# Altium footprint library UltraZOhm_CarrierBoard.PcbLib: 124 footprints (part 1 of 8)
Each footprint in its own frame and in the unit in brackets; x right, y up, seen from the top. Pads: shape width x height; smd on the part's side, far side on the other; paste and mask are expansions set on the pad; w line width, h text height; cw(c..) or ccw(c..) is an arc to the next point about the centre after c.
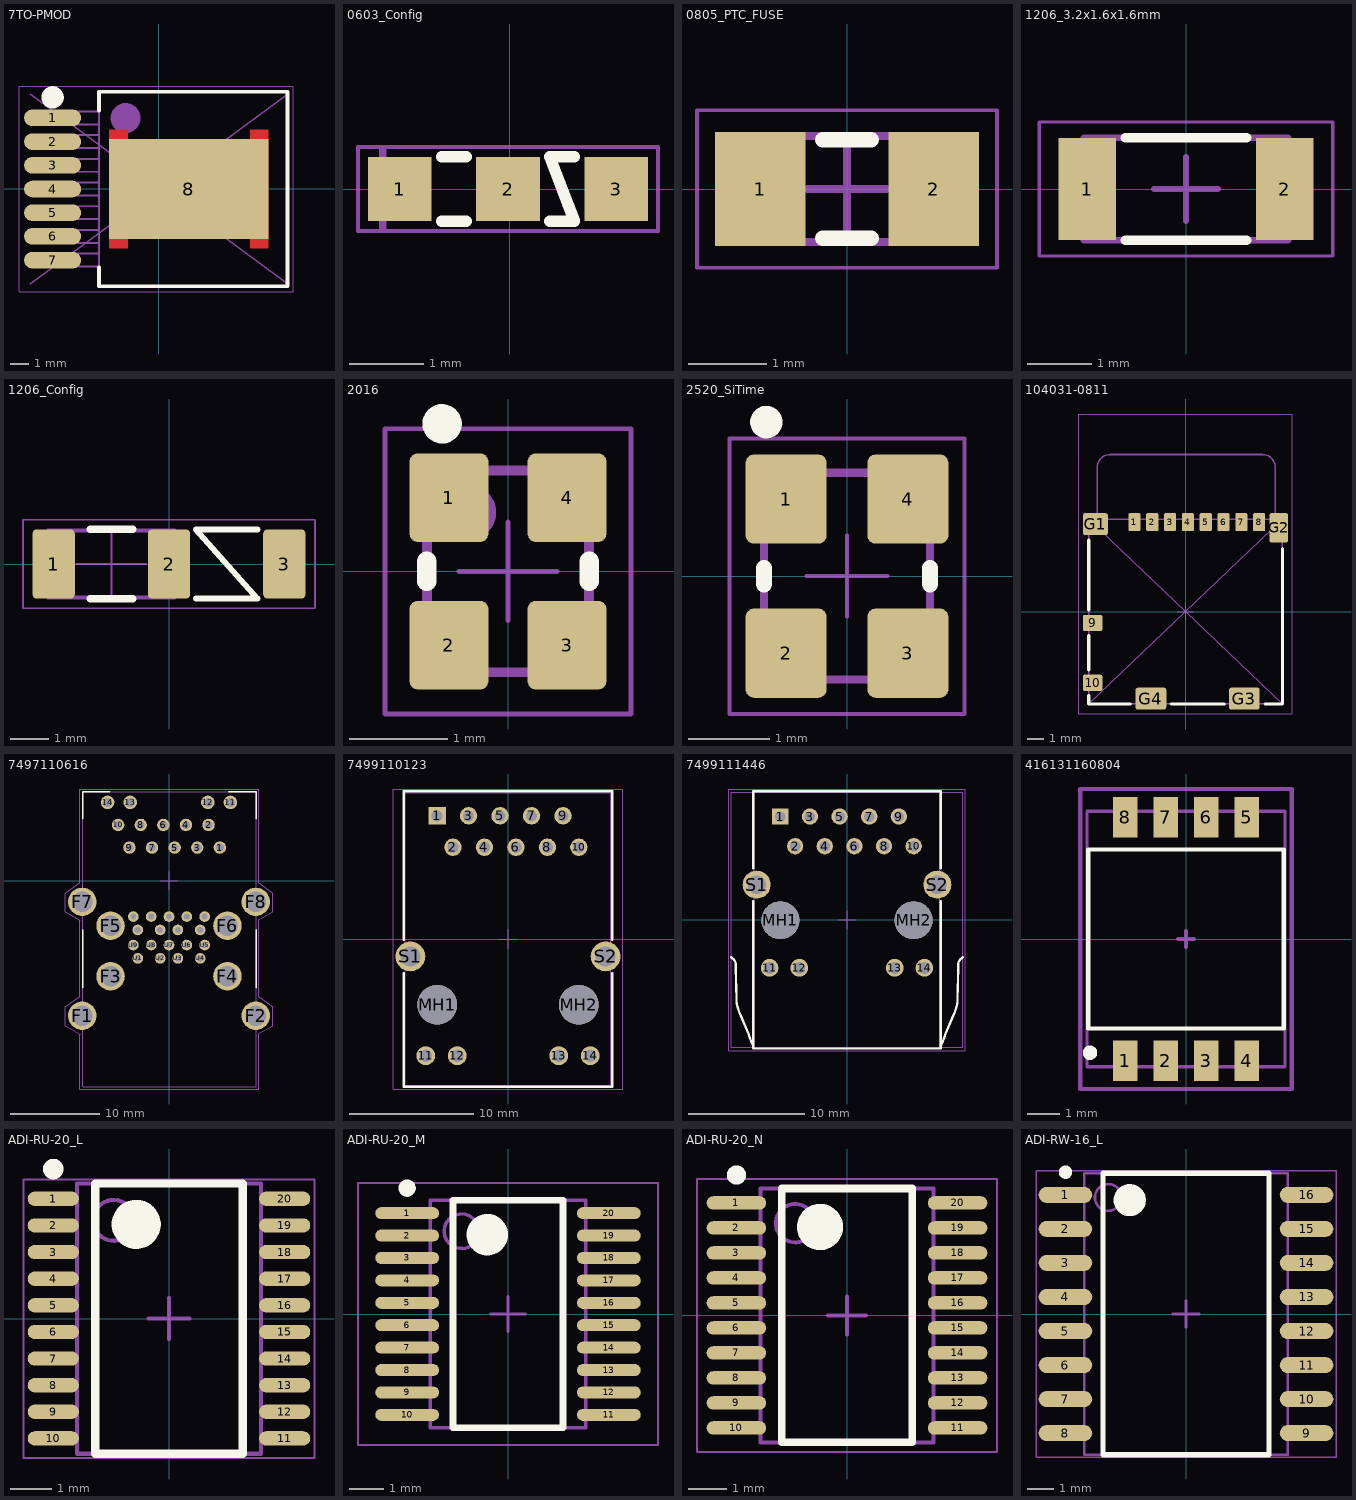
[diagram p0: the footprints below, top view; thin cyan lines are the x and y axes]

## 7TO-PMOD [mm]
height 4.67
pads (8):
  oval 3.06x0.89 smd: 1(-5.7,3.81) 2(-5.7,2.54) 3(-5.7,1.27) 4(-5.7,0) 5(-5.7,-1.27) 6(-5.7,-2.54) 7(-5.7,-3.81)
  rect 8.54x5.35 smd: 8(1.605,0)
Top Layer:
  region: -2.665,3.2 -2.665,-3.2 -1.665,-3.2 -1.665,3.2
  region: 5.875,-3.2 5.875,3.2 4.875,3.2 4.875,-3.2
Top Overlay:
  circle w0.6: c-5.7,4.91 r0.3
  lines w0.2: -3.215,-4.205 -3.215,-5.205 6.885,-5.205 6.885,5.205 -3.215,5.205 -3.215,4.205
M5 Assembly Top:
  circle w0.8: c-1.79,3.8 r0.4
  lines w0.1: -6.89,-4.155 -3.215,-4.155 ; -6.89,-3.465 -3.215,-3.465 ; -6.89,-2.885 -3.215,-2.885 ; -6.89,-2.195 -3.215,-2.195 ; -6.89,-1.615 -3.215,-1.615 ; -6.89,-0.925 -3.215,-0.925 ; -6.89,-0.345 -3.215,-0.345 ; -6.89,0.345 -3.215,0.345 ; -6.89,0.925 -3.215,0.925 ; -6.89,1.615 -3.215,1.615 ; -6.89,2.195 -3.215,2.195 ; -6.89,2.885 -3.215,2.885 ; -6.89,3.465 -3.215,3.465 ; -6.89,4.155 -3.215,4.155 ; -6.885,-4.155 -6.885,-3.465 ; -6.885,-2.885 -6.885,-2.195 ; -6.885,-1.615 -6.885,-0.925 ; -6.885,-0.345 -6.885,0.345 ; -6.885,0.925 -6.885,1.615 ; -6.885,2.195 -6.885,2.885 ; -6.885,3.465 -6.885,4.155 ; -4.79,-4.155 -4.79,-3.465 ; -4.79,-2.885 -4.79,-2.195 ; -4.79,-1.615 -4.79,-0.925 ; -4.79,-0.345 -4.79,0.345 ; -4.79,0.93 -4.79,1.615 ; -4.79,2.205 -4.79,2.885 ; -4.79,3.465 -4.79,4.155 ; -3.215,-5.205 6.885,-5.205 6.885,5.205 -3.215,5.205 -3.215,-5.205
  text ".Designator" at 2.725,-1.89 h1.52
Mechanical 15:
  lines w0.05: -0.5,0 0.5,0 ; 0,-0.5 0,0.5 ; -7.5,-5.5 7.2,-5.5 7.2,5.5 -7.5,5.5 -7.5,-5.5
  lines w0.1: -6.885,-5.08 6.885,5.08 ; -6.885,5.08 6.885,-5.08
3D body "NDW0007A.stp": height 4.77, standoff 0, extent -6.885,-5.08 6.885,5.08
3D body: height 4.8, standoff 0, extent -2.139,2.275 -0.14,4.275

## 0603_Config [mm] "0603 3-Pin Config Footprint"
height 1
pads (3):
  rect 0.85x0.85 smd: 1(-1.475,0) 2(-0.025,0) 3(1.425,0)
Top Overlay:
  lines w0.152: -0.914,-0.432 -0.584,-0.432 ; -0.914,0.432 -0.584,0.432 ; 0.533,-0.432 0.864,-0.432 0.533,0.432 0.864,0.432
M5 Assembly Top:
  lines w0.054: -2.032,-0.559 -2.032,0.559 1.981,0.559 1.981,-0.559 -2.032,-0.559
  lines w0.102: -1.7,-0.525 -1.7,0.525
  text ".Designator" at -1.4,-0.4 h0.76
3D body: height 2.8, standoff -2.8, extent -1.537,-1.143 -1.537,-1.143
3D body "User Library-RESC1608X___.STEP": height 0.3, standoff 0, extent -1.55,-0.4 0.05,0.4

## 0805_PTC_FUSE [mm] "Surface Mount PTC, Body 2.0x1.2mm, Height 1.0mm, IPC Medium Density"
height 1
pads (2):
  rect 1.15x1.45 smd: 1(-1.1,0) 2(1.1,0)
Top Overlay:
  lines w0.2: -0.304,-0.625 0.304,-0.625 ; -0.304,0.625 0.304,0.625
M5 Assembly Top:
  lines w0.1: -1.05,-0.675 1.05,-0.675 1.05,0.675 -1.05,0.675 -1.05,-0.675
  text ".Designator" at -0.8,-0.4 h0.76
Mechanical 15:
  lines w0.05: -1.905,1 1.902,1 1.902,-1 ; -1.902,1 -1.902,-1 1.905,-1
  lines w0.1: -0.5,0 0.5,0 ; 0,-0.5 0,0.5
3D body: height 0.6, standoff 0, extent 0.7,-0.675 1.05,0.675
3D body: height 0.6, standoff 0, extent -1.05,-0.675 -0.7,0.675
3D body: height 0.6, standoff 0, extent -0.7,-0.675 0.7,0.675

## 1206_3.2x1.6x1.6mm [mm] "Ceramic Capacitors, 1206, body 3.2x1.6mm"
height 1.6
pads (2):
  rect 0.9x1.6 smd: 1(-1.55,0) 2(1.55,0)
Top Overlay:
  lines w0.15: -0.95,-0.8 0.95,-0.8 ; -0.95,0.8 0.95,0.8
M5 Assembly Top:
  lines w0.1: -1.6,-0.8 1.6,-0.8 1.6,0.8 -1.6,0.8 -1.6,-0.8
  text ".Designator" at -1,-0.4 h0.76
Mechanical 15:
  lines w0.05: -2.3,-1.05 2.3,-1.05 2.3,1.05 -2.3,1.05 -2.3,-1.05
  lines w0.1: -0.5,0 0.5,0 ; 0,-0.5 0,0.5
3D body "3.2x1.6x1.6x0.6.stp": height 1.63, standoff 0.03, extent -1.6,-0.8 1.6,0.8

## 1206_Config [mm] "1206 3-Pin Config Footprint"
height 1
pads (3):
  rrect20% 1.1x1.8 smd: 1(-3,0) 2(0,0) 3(3,0)
Top Overlay:
  lines w0.152: 0.7,-0.9 2.3,-0.9 0.7,0.9 2.3,0.9
  lines w0.2: -2.05,-0.9 -0.95,-0.9 ; -2.05,0.9 -0.95,0.9
M5 Assembly Top:
  lines w0.1: -2.6,-0.875 -2.6,0.875 ; -0.4,-0.875 -0.4,0.875 ; -3.15,-0.875 -1.5,-0.875 0.15,-0.875 0.15,0.875 -3.15,0.875 -3.15,-0.875
  text ".Designator" at -2.3,-0.4 h0.76
Mechanical 15:
  lines w0.05: -2.4,0 -1.5,0 ; -1.5,-0.9 -1.5,0 ; -1.5,0.9 -1.5,0 ; -0.6,0 -1.5,0 ; -3.8,-1.15 -1.5,-1.15 3.8,-1.15 3.8,1.15 -3.8,1.15 -3.8,-1.15
3D body: height 2.8, standoff -2.8, extent -1.537,1.357 -1.537,1.357
3D body "RESC3216X06N.STEP": height 0.55, standoff 0, extent -3.1,-0.8 0.1,0.8

## 2016 [mm]
height 0.8
pads (4):
  rrect20% 0.8x0.9 smd: 1(-0.6,0.75) 2(-0.6,-0.75) 3(0.6,-0.75) 4(0.6,0.75)
Top Overlay:
  circle w0.2: c-0.67,1.5 r0.1
  lines w0.2: -0.825,-0.1 -0.825,0.1 ; 0.825,-0.1 0.825,0.1
M5 Assembly Top:
  circle w0.28: c-0.4,0.6 r0.14
  lines w0.1: -0.825,-1.025 0.825,-1.025 0.825,1.025 ; -0.825,-1.025 -0.825,-1.025 ; -0.825,-1.025 -0.825,1.025 0.825,1.025 ; 0.825,1.025 0.825,1.025
  text ".Designator" at -0.7,-0.7 h0.76
Mechanical 15:
  lines w0.05: -0.5,0 0.5,0 ; 0,-0.5 0,0.5 ; -1.25,-1.45 -1.25,1.45 1.25,1.45 1.25,-1.45 -1.25,-1.45
3D body: height 0.8, standoff 0, extent -0.825,-1.025 0.825,1.025
3D body: height 0.81, standoff 0, extent -0.6,0.4 -0.2,0.8

## 2520_SiTime [mm] "Standard Clock Oscillators, 2.5mm x 2mm"
height 0.75
pads (4):
  rrect20% 1x1.1 smd: 1(-0.75,0.95) 2(-0.75,-0.95) 3(0.75,-0.95) 4(0.75,0.95)
Top Overlay:
  circle w0.2: c-0.995,1.9 r0.1
  lines w0.2: -1.025,-0.1 -1.025,0.1 ; 1.025,-0.1 1.025,0.1
M5 Assembly Top:
  circle w0.28: c-0.575,0.875 r0.14
  lines w0.1: -1.025,-1.275 -1.025,1.275 1.025,1.275 1.025,-1.275 -1.025,-1.275 ; -0.825,-1.025 -0.825,-1.025 ; 0.825,1.025 0.825,1.025
  text ".Designator" at -0.8,-0.6 h0.76
Mechanical 15:
  lines w0.05: -0.5,0 0.5,0 ; 0,-0.5 0,0.5 ; -1.45,-1.7 1.45,-1.7 1.45,1.7 -1.45,1.7 -1.45,-1.7
3D body: height 0.81, standoff 0, extent -0.6,0.4 -0.2,0.8
3D body: height 0.8, standoff 0, extent -0.825,-1.025 0.825,1.025

## 104031-0811 [mm]
height 1.46
pads (14):
  rrect20% 0.75x1.1 smd: 1(-3.155,5.525) 2(-2.055,5.525) 3(-0.955,5.525) 4(0.145,5.525) 5(1.245,5.525) 6(2.345,5.525) 7(3.445,5.525) 8(4.545,5.525)
  rrect20% 1.2x1 smd: 9(-5.74,-0.7) 10(-5.74,-4.4)
  rrect20% 1.55x1.35 smd: G1(-5.565,5.4)
  rrect20% 1.17x1.8 smd: G2(5.755,5.175)
  rrect20% 1.9x1.35 smd: G3(3.63,-5.375) G4(-2.14,-5.375)
Top Overlay:
  lines w0.2: -5.975,-5.2 -5.975,-5.705 -3.4,-5.705 ; -5.975,-3.6 -5.975,-1.5 ; -5.975,0.1 -5.975,4.4 ; -0.9,-5.7 2.4,-5.7 ; 4.9,-5.7 5.98,-5.7 5.98,3.9
M5 Assembly Top:
  lines w0.1: -5.565,5.7 0,5.7 ; -5.455,5.7 -5.455,8.9 ; 5.545,5.7 5.545,8.9 ccw(c4.745,8.9) 4.745,9.7 -4.655,9.7 ; -5.455,8.9 cw(c-4.655,8.9) -4.655,9.7 ; -5.455,8.9 cw(c-4.655,8.9) -4.655,9.7 ; -5.975,-5.7 5.975,-5.7 5.975,5.7 -5.975,5.7 -5.975,-5.7
  text ".Designator" at -2.1,-0.7 h1.52
Mechanical 15:
  lines w0.05: -5.975,-5.7 5.975,5.7 ; -5.975,5.7 5.975,-5.7 ; -0.5,0 0.5,0 ; -0.1,5.7 0.1,5.7 ; 0,-0.5 0,0.5 ; 0,5.6 0,5.8 ; -6.6,-6.3 -6.6,12.2 6.6,12.2 6.6,-6.3 -6.6,-6.3
3D body "SW3dPS-Micro_SD.STEP": height 1.45, standoff 0.47, extent -5.5,-5.3 5.5,9.7
3D body "1040310811.stp": height 1.43, standoff -0.02, extent -5.975,-5.7 5.975,5.7

## 7497110616 [mm]
pads (40):
  round 1.39 hole 0.9: 1(5.715,3.72) 2(4.445,6.26) 3(3.175,3.72) 4(1.905,6.26) 5(0.635,3.72) 6(-0.635,6.26) 7(-1.905,3.72) 8(-3.175,6.26) 9(-4.445,3.72) 10(-5.715,6.26)
  round 1.53 hole 1: 11(6.9,8.8) 12(4.36,8.8) 13(-4.36,8.8) 14(-6.9,8.8)
  round 3.2 hole 2.3: F1(-9.75,-15.16) F2(9.75,-15.16) F3(-6.57,-10.73) F4(6.57,-10.73) F5(-6.57,-5.05) F6(6.57,-5.05) F7(-9.75,-2.38) F8(9.75,-2.38)
  round 1.2 hole 0.7: U1(-3.5,-8.73) U2(-1,-8.73) U3(1,-8.73) U4(3.5,-8.73) U5(4,-7.23) U6(2,-7.23) U7(0,-7.23) U8(-2,-7.23) U9(-4,-7.23) U10(-3.5,-5.53) U11(-1,-5.53) U12(1,-5.53) U13(3.5,-5.53) U14(4,-4.03) U15(2,-4.03) U16(0,-4.03) U17(-2,-4.03) U18(-4,-4.03)
Top Overlay:
  lines w0.2: -9.7,6.95 -9.7,10 -6.65,10 ; -9.699,-12 -9.699,-5.5 ; 6.751,10 9.801,10 9.801,6.95 ; 9.801,-12 9.801,-5.5
M5 Assembly Top:
  lines w0.1: -9.699,-23.155 9.801,-23.155 9.801,9.995 -9.699,9.995 -9.699,-23.155
  text ".Designator" at -2.56,-7.303 h1.52
Mechanical 15:
  lines w0.05: -10.013,-4.45 -11.65,-3.5 -11.65,-1.4 -10,-0.25 -10,10.3 10.1,10.3 10.1,-0.25 11.65,-1.4 11.65,-3.5 10.1,-4.4 10.1,-13.03 11.65,-14.18 11.65,-16.28 10.043,-17.213 ; -10,-17.241 -10,-23.4 10.05,-23.4 10.049,-17.224 ; -10,-12.954 -10,-4.45 ; -9.997,-12.954 -11.65,-14.18 -11.65,-16.28 -9.995,-17.241 ; -1,0 1,0 ; 0,-1 0,1
3D body "7497110616.stp": height 31.35, standoff -3.65, extent -9.75,-23.175 9.75,9.975

## 7499110123 [mm] "LAN Transformer, body 23.6x16.6mm"
height 17.1
pads (18):
  rect 1.4x1.4 hole 0.89: 1(-5.715,9.94)
  round 1.4 hole 0.89: 2(-4.445,7.4) 3(-3.175,9.94) 4(-1.905,7.4) 5(-0.635,9.94) 6(0.635,7.4) 7(1.905,9.94) 8(3.175,7.4) 9(4.445,9.94) 10(5.715,7.4)
  round 1.52 hole 1.02: 11(-6.635,-9.41) 12(-4.095,-9.41) 13(4.095,-9.41) 14(6.635,-9.41)
  round 3.2 hole 3.2 unplated: MH1(-5.715,-5.3) MH2(5.715,-5.3)
  round 2.4 hole 1.63: S1(-7.875,-1.41) S2(7.875,-1.41)
Top Overlay:
  lines w0.2: -8.4,-2.77 -8.4,-11.9 8.4,-11.9 8.4,-2.77 ; -8.4,-0.05 -8.4,11.9 8.4,11.9 8.4,-0.05
M5 Assembly Top:
  lines w0.1: -8.3,-11.8 8.3,-11.8 8.3,11.8 -8.3,11.8 -8.3,-11.8
  text ".Designator" at -1.3,-0.8 h1.52
Mechanical 11:
  lines w0.1: -8.3,-11.8 -8.3,11.8 8.3,11.8 8.3,-11.8 -8.3,-11.8
Mechanical 15:
  lines w0.1: -0.8,0 0.8,0 ; 0,-0.8 0,0.8 ; -9.275,-12.1 9.275,-12.1 9.275,12.1 -9.275,12.1 -9.275,-12.1
3D body "7499110123.stp": height 17.2, standoff -2.7, extent -8.3,-11.8 8.3,11.8

## 7499111446 [mm] "LAN Transformer, body 21.84x15.88mm"
height 13.95
pads (18):
  rect 1.4x1.4 hole 0.9: 1(-5.715,8.86)
  round 1.4 hole 0.9: 2(-4.445,6.32) 3(-3.175,8.86) 4(-1.905,6.32) 5(-0.635,8.86) 6(0.635,6.32) 7(1.905,8.86) 8(3.175,6.32) 9(4.445,8.86) 10(5.715,6.32)
  round 1.52 hole 1.02: 11(-6.63,-4.11) 12(-4.09,-4.11) 13(4.09,-4.11) 14(6.63,-4.11)
  round 3.25 hole 3.25 unplated: MH1(-5.715,-0.03) MH2(5.715,-0.03)
  round 2.4 hole 1.6: S1(-7.745,3.02) S2(7.745,3.02)
Top Overlay:
  lines w0.2: -9.93,-3.209 cw(c-10.325,-3.901) -9.528,-3.901 -9.47,-7 ccw(c-8.2,-7) -9.37,-7.494 ccw(c-6.9,-7) -9.112,-8.205 -8.445,-9.764 ccw(c-2.1,-7.88) -8.04,-10.8 ; -8.04,1.61 -8.04,-11.02 8.04,-11.02 8.04,1.61 ; -8.04,4.44 -8.04,11.02 8.04,11.02 8.04,4.44 ; 8.04,-10.8 ccw(c2.1,-7.88) 8.445,-9.764 9.112,-8.205 ccw(c6.9,-7) 9.37,-7.494 ccw(c8.2,-7) 9.47,-7 9.528,-3.901 cw(c10.325,-3.901) 9.93,-3.209
M5 Assembly Top:
  lines w0.1: -9.923,-10.92 9.923,-10.92 9.923,10.92 -9.923,10.92 -9.923,-10.92
  text ".Designator" at 0,0 h1.6
Mechanical 11:
  lines w0.1: -7.94,-10.92 -7.94,10.92 7.94,10.92 7.94,-10.92 -7.94,-10.92
Mechanical 15:
  lines w0.1: -0.8,0 0.8,0 ; 0,-0.8 0,0.8 ; -10.13,-11.22 -10.13,11.22 10.13,11.22 10.13,-11.22 -10.13,-11.22
3D body "7499111446.stp": height 16.01, standoff -3.52, extent -9.923,-10.92 9.923,10.92

## 416131160804 [mm] "04p, 1.27mm Pitch, Horizontal, HP Type, SMT, flat Actuator, black, with Tape, T&R"
height 3.3
pads (8):
  rect 0.76x1.27 smd: 1(-1.905,-3.81) 2(-0.635,-3.81) 3(0.635,-3.81) 4(1.905,-3.81) 5(1.905,3.81) 6(0.635,3.81) 7(-0.635,3.81) 8(-1.905,3.81)
Top Overlay:
  circle w0.25: c-3.005,-3.56 r0.1
  lines w0.127: -3.06,-2.8 -3.06,2.8 3.06,2.8 3.06,-2.8 -3.06,-2.8
M5 Assembly Top:
  lines w0.1: -3.1,-4 3.1,-4 3.1,4 -3.1,4 -3.1,-4
  text ".Designator" at -0.7,-0.4 h0.76
Mechanical 15:
  lines w0.127: -0.254,0 0.254,0 ; 0,-0.254 0,0.254 ; -3.31,-4.695 -3.31,4.695 3.31,4.695 3.31,-4.695 -3.31,-4.695
3D body "416131160804.stp": height 2.06, standoff -0.04, extent -3.06,-4 3.06,4

## ADI-RU-20_L [mm] "SOP, 20-Leads, Body 6.5x4.4mm, Pitch 0.65mm, IPC High Density"
height 1.2
pads (20):
  oval 1.25x0.35 smd: 1(-2.825,2.925) 2(-2.825,2.275) 3(-2.825,1.625) 4(-2.825,0.975) 5(-2.825,0.325) 6(-2.825,-0.325) 7(-2.825,-0.975) 8(-2.825,-1.625) 9(-2.825,-2.275) 10(-2.825,-2.925) 11(2.825,-2.925) 12(2.825,-2.275) 13(2.825,-1.625) 14(2.825,-0.975) 15(2.825,-0.325) 16(2.825,0.325) 17(2.825,0.975) 18(2.825,1.625) 19(2.825,2.275) 20(2.825,2.925)
Top Overlay:
  circle w0.25: c-2.825,3.65 r0.125
  circle w0.6: c-0.8,2.3 r0.3
  lines w0.2: -1.8,-3.3 -1.8,3.3 1.8,3.3 1.8,-3.3 -1.8,-3.3
M5 Assembly Top:
  circle w0.1: c-1.35,2.4 r0.5
  lines w0.1: -2.25,-3.3 -2.25,3.3 2.25,3.3 2.25,-3.3 -2.25,-3.3
  text ".Designator" at -0.8,-0.4 h0.76
Mechanical 15:
  lines w0.05: -3.55,-3.4 -3.55,3.4 3.55,3.4 3.55,-3.4 -3.55,-3.4
  lines w0.1: -0.5,0 0.5,0 ; 0,-0.5 0,0.5
3D body: height 1.2, standoff 0.05, extent -2.25,-3.3 2.25,3.3

## ADI-RU-20_M [mm] "SOP, 20-Leads, Body 6.5x4.4mm, Pitch 0.65mm, IPC Low Density"
height 1.2
pads (20):
  oval 1.85x0.35 smd: 1(-2.925,2.925) 2(-2.925,2.275) 3(-2.925,1.625) 4(-2.925,0.975) 5(-2.925,0.325) 6(-2.925,-0.325) 7(-2.925,-0.975) 8(-2.925,-1.625) 9(-2.925,-2.275) 10(-2.925,-2.925) 11(2.925,-2.925) 12(2.925,-2.275) 13(2.925,-1.625) 14(2.925,-0.975) 15(2.925,-0.325) 16(2.925,0.325) 17(2.925,0.975) 18(2.925,1.625) 19(2.925,2.275) 20(2.925,2.925)
Top Overlay:
  circle w0.6: c-0.6,2.3 r0.3
  circle w0.25: c-2.925,3.65 r0.125
  lines w0.2: -1.6,-3.3 1.6,-3.3 1.6,3.3 -1.6,3.3 -1.6,-3.3
M5 Assembly Top:
  circle w0.1: c-1.35,2.4 r0.5
  lines w0.1: -2.25,-3.3 2.25,-3.3 2.25,3.3 -2.25,3.3 -2.25,-3.3
  text ".Designator" at -0.6,-0.4 h0.76
Mechanical 15:
  lines w0.05: -4.35,-3.8 4.35,-3.8 4.35,3.8 -4.35,3.8 -4.35,-3.8
  lines w0.1: -0.5,0 0.5,0 ; 0,-0.5 0,0.5
3D body: height 1.2, standoff 0.05, extent -2.25,-3.3 2.25,3.3

## ADI-RU-20_N [mm] "SOP, 20-Leads, Body 6.5x4.4mm, Pitch 0.65mm, IPC Medium Density"
height 1.2
pads (20):
  oval 1.55x0.35 smd: 1(-2.875,2.925) 2(-2.875,2.275) 3(-2.875,1.625) 4(-2.875,0.975) 5(-2.875,0.325) 6(-2.875,-0.325) 7(-2.875,-0.975) 8(-2.875,-1.625) 9(-2.875,-2.275) 10(-2.875,-2.925) 11(2.875,-2.925) 12(2.875,-2.275) 13(2.875,-1.625) 14(2.875,-0.975) 15(2.875,-0.325) 16(2.875,0.325) 17(2.875,0.975) 18(2.875,1.625) 19(2.875,2.275) 20(2.875,2.925)
Top Overlay:
  circle w0.25: c-2.875,3.65 r0.125
  circle w0.6: c-0.7,2.3 r0.3
  lines w0.2: -1.7,-3.3 -1.7,3.3 1.7,3.3 1.7,-3.3 -1.7,-3.3
M5 Assembly Top:
  circle w0.1: c-1.35,2.4 r0.5
  lines w0.1: -2.25,-3.3 -2.25,3.3 2.25,3.3 2.25,-3.3 -2.25,-3.3
  text ".Designator" at -0.4,-0.3 h0.76
Mechanical 15:
  lines w0.05: -3.9,-3.55 -3.9,3.55 3.9,3.55 3.9,-3.55 -3.9,-3.55
  lines w0.1: -0.5,0 0.5,0 ; 0,-0.5 0,0.5
3D body: height 1.2, standoff 0.05, extent -2.25,-3.3 2.25,3.3

## ADI-RW-16_L [mm] "SOIC, 16-Leads, Body 10.3x7.5mm, Pitch 1.27mm, IPC High Density"
height 2.65
pads (16):
  oval 2x0.6 smd: 1(-4.5,4.445) 2(-4.5,3.175) 3(-4.5,1.905) 4(-4.5,0.635) 5(-4.5,-0.635) 6(-4.5,-1.905) 7(-4.5,-3.175) 8(-4.5,-4.445) 9(4.5,-4.445) 10(4.5,-3.175) 11(4.5,-1.905) 12(4.5,-0.635) 13(4.5,0.635) 14(4.5,1.905) 15(4.5,3.175) 16(4.5,4.445)
Top Overlay:
  circle w0.25: c-4.5,5.295 r0.125
  circle w0.6: c-2.1,4.25 r0.3
  lines w0.2: -3.1,-5.25 -3.1,5.25 3.1,5.25 3.1,-5.25 -3.1,-5.25
M5 Assembly Top:
  circle w0.1: c-2.9,4.35 r0.5
  lines w0.1: -3.8,-5.25 -3.8,5.25 3.8,5.25 3.8,-5.25 -3.8,-5.25
  text ".Designator" at -0.9,-0.7 h1.52
Mechanical 15:
  lines w0.05: -5.6,-5.35 -5.6,5.35 5.6,5.35 5.6,-5.35 -5.6,-5.35
  lines w0.1: -0.5,0 0.5,0 ; 0,-0.5 0,0.5
3D body: height 2.65, standoff 0.1, extent -3.8,-5.25 3.8,5.25